# Altium schematic symbol library jlcpcb_2025_04_inductors_extended_0805.schlib: 882 symbols (part 2 of 5) (continued)
## GBL201209P-2R2K
designator L?  Inductance: 2.2uH
Inductor, 2.2uH, ±10%, 650mΩ, 30mA, SMD 0805; Manufacturer: Gotrend Tech; Manufacturer Part Number: GBL201209P-2R2K; Package Size: 0805; JLCPCB Basic Part: No; JLCPCB Part Number: C226155; Supplier 1: LCSC; Category: Inductors; Supplier Part Number 1: C226155; Tolerance: ±10%; Rated Current: 30mA; DC Resistance: 650mΩ; RoHS: Yes; ComponentLink1Description: Datasheet; ComponentLink1URL: https://wmsc.lcsc.com/wmsc/upload/file/pdf/v2/lcsc/1809211933_Gotrend-Tech-GBL201209P-2R2K_C226155.pdf; ComponentLink2Description: JLCPCB Part URL; ComponentLink2URL: https://jlcpcb.com/partdetail/C226155; ComponentLink3Description: LCSC Part URL; ComponentLink3URL: https://lcsc.com/product-detail/Inductors-SMD_Gotrend-Tech-Gotrend-Tech-GBL201209P-2R2K_C226155.html
footprint IND-0805 (0805 (2012M) Inductor)
pins: 1, 2

## GGW0805UCR68KGT
designator L?  Inductance: 680nH
Inductor, 680nH, ±10%, 2.1Ω, 190mA, SMD 0805; Manufacturer: GOOGLL(Zhaoqing Guoju Elec); Manufacturer Part Number: GGW0805UCR68KGT; Self-Resonant Frequency: 300MHz; Q Factor: 23@50MHz; Package Size: 0805; JLCPCB Basic Part: No; JLCPCB Part Number: C343182; Supplier 1: LCSC; Category: Inductors; Supplier Part Number 1: C343182; Tolerance: ±10%; Rated Current: 190mA; DC Resistance: 2.1Ω; RoHS: Yes; ComponentLink1Description: Datasheet; ComponentLink1URL: https://datasheet.lcsc.com/lcsc/1912111437_GOOGLL-Zhaoqing-Guoju-Elec-GGW0805UCR68KGT_C343182.pdf; ComponentLink2Description: JLCPCB Part URL; ComponentLink2URL: https://jlcpcb.com/partdetail/C343182; ComponentLink3Description: LCSC Part URL; ComponentLink3URL: https://lcsc.com/product-detail/Inductors-SMD_GOOGLLZhaoqing-Guoju-Elec-GOOGLLZhaoqing-Guoju-Elec-GGW0805UCR68KGT_C343182.html
footprint IND-0805 (0805 (2012M) Inductor)
pins: 1, 2

## HBLS2012-1N0S
designator L?  Inductance: 1nH
Inductor, 1nH, 0.1Ω, 600mA, SMD 0805; Manufacturer: HYHONGYEX; Manufacturer Part Number: HBLS2012-1N0S; Self-Resonant Frequency: 3GHz; Q Factor: 10@100MHz; Package Size: 0805; JLCPCB Basic Part: No; JLCPCB Part Number: C964052; Supplier 1: LCSC; Category: Inductors; Supplier Part Number 1: C964052; Rated Current: 600mA; DC Resistance: 0.1Ω; RoHS: Yes; ComponentLink1Description: Datasheet; ComponentLink1URL: https://wmsc.lcsc.com/wmsc/upload/file/pdf/v2/lcsc/2012171939_HYHONGYEX-HBLS2012-1N0S_C964052.pdf; ComponentLink2Description: JLCPCB Part URL; ComponentLink2URL: https://jlcpcb.com/partdetail/C964052; ComponentLink3Description: LCSC Part URL; ComponentLink3URL: https://lcsc.com/product-detail/Inductors-SMD_HYHONGYEX-HYHONGYEX-HBLS2012-1N0S_C964052.html
footprint IND-0805 (0805 (2012M) Inductor)
pins: 1, 2

## HBLS2012-1N5S
designator L?  Inductance: 1.5nH
Inductor, 1.5nH, 0.1Ω, 600mA, SMD 0805; Manufacturer: HYHONGYEX; Manufacturer Part Number: HBLS2012-1N5S; Self-Resonant Frequency: 3GHz; Q Factor: 10@100MHz; Package Size: 0805; JLCPCB Basic Part: No; JLCPCB Part Number: C964053; Supplier 1: LCSC; Category: Inductors; Supplier Part Number 1: C964053; Rated Current: 600mA; DC Resistance: 0.1Ω; RoHS: Yes; ComponentLink1Description: Datasheet; ComponentLink1URL: https://wmsc.lcsc.com/wmsc/upload/file/pdf/v2/lcsc/2012171939_HYHONGYEX-HBLS2012-1N5S_C964053.pdf; ComponentLink2Description: JLCPCB Part URL; ComponentLink2URL: https://jlcpcb.com/partdetail/C964053; ComponentLink3Description: LCSC Part URL; ComponentLink3URL: https://lcsc.com/product-detail/Inductors-SMD_HYHONGYEX-HYHONGYEX-HBLS2012-1N5S_C964053.html
footprint IND-0805 (0805 (2012M) Inductor)
pins: 1, 2

## HBLS2012-2N2S
designator L?  Inductance: 2.2nH
Inductor, 2.2nH, 0.1Ω, 600mA, SMD 0805; Manufacturer: HYHONGYEX; Manufacturer Part Number: HBLS2012-2N2S; Self-Resonant Frequency: 3GHz; Q Factor: 10@100MHz; Package Size: 0805; JLCPCB Basic Part: No; JLCPCB Part Number: C964055; Supplier 1: LCSC; Category: Inductors; Supplier Part Number 1: C964055; Rated Current: 600mA; DC Resistance: 0.1Ω; RoHS: Yes; ComponentLink1Description: Datasheet; ComponentLink1URL: https://wmsc.lcsc.com/wmsc/upload/file/pdf/v2/lcsc/2012171939_HYHONGYEX-HBLS2012-2N2S_C964055.pdf; ComponentLink2Description: JLCPCB Part URL; ComponentLink2URL: https://jlcpcb.com/partdetail/C964055; ComponentLink3Description: LCSC Part URL; ComponentLink3URL: https://lcsc.com/product-detail/Inductors-SMD_HYHONGYEX-HYHONGYEX-HBLS2012-2N2S_C964055.html
footprint IND-0805 (0805 (2012M) Inductor)
pins: 1, 2

## HBLS2012-3N9S
designator L?  Inductance: 3.9nH
Inductor, 3.9nH, 0.15Ω, 600mA, SMD 0805; Manufacturer: HYHONGYEX; Manufacturer Part Number: HBLS2012-3N9S; Self-Resonant Frequency: 3GHz; Q Factor: 10@100MHz; Package Size: 0805; JLCPCB Basic Part: No; JLCPCB Part Number: C964058; Supplier 1: LCSC; Category: Inductors; Supplier Part Number 1: C964058; Rated Current: 600mA; DC Resistance: 0.15Ω; RoHS: Yes; ComponentLink1Description: Datasheet; ComponentLink1URL: https://wmsc.lcsc.com/wmsc/upload/file/pdf/v2/lcsc/2012171939_HYHONGYEX-HBLS2012-3N9S_C964058.pdf; ComponentLink2Description: JLCPCB Part URL; ComponentLink2URL: https://jlcpcb.com/partdetail/C964058; ComponentLink3Description: LCSC Part URL; ComponentLink3URL: https://lcsc.com/product-detail/Inductors-SMD_HYHONGYEX-HYHONGYEX-HBLS2012-3N9S_C964058.html
footprint IND-0805 (0805 (2012M) Inductor)
pins: 1, 2

## HBLS2012-4N7S
designator L?  Inductance: 4.7nH
Inductor, 4.7nH, 0.2Ω, 400mA, SMD 0805; Manufacturer: HYHONGYEX; Manufacturer Part Number: HBLS2012-4N7S; Self-Resonant Frequency: 3GHz; Q Factor: 10@100MHz; Package Size: 0805; JLCPCB Basic Part: No; JLCPCB Part Number: C964059; Supplier 1: LCSC; Category: Inductors; Supplier Part Number 1: C964059; Rated Current: 400mA; DC Resistance: 0.2Ω; RoHS: Yes; ComponentLink1Description: Datasheet; ComponentLink1URL: https://wmsc.lcsc.com/wmsc/upload/file/pdf/v2/lcsc/2012171940_HYHONGYEX-HBLS2012-4N7S_C964059.pdf; ComponentLink2Description: JLCPCB Part URL; ComponentLink2URL: https://jlcpcb.com/partdetail/C964059; ComponentLink3Description: LCSC Part URL; ComponentLink3URL: https://lcsc.com/product-detail/Inductors-SMD_HYHONGYEX-HYHONGYEX-HBLS2012-4N7S_C964059.html
footprint IND-0805 (0805 (2012M) Inductor)
pins: 1, 2

## HBLS2012-10NJ
designator L?  Inductance: 10nH
Inductor, 10nH, ±5%, 0.3Ω, 300mA, SMD 0805; Manufacturer: HYHONGYEX; Manufacturer Part Number: HBLS2012-10NJ; Self-Resonant Frequency: 2.5GHz; Q Factor: 10@100MHz; Package Size: 0805; JLCPCB Basic Part: No; JLCPCB Part Number: C964063; Supplier 1: LCSC; Category: Inductors; Supplier Part Number 1: C964063; Tolerance: ±5%; Rated Current: 300mA; DC Resistance: 0.3Ω; RoHS: Yes; ComponentLink1Description: Datasheet; ComponentLink1URL: https://wmsc.lcsc.com/wmsc/upload/file/pdf/v2/lcsc/2012171940_HYHONGYEX-HBLS2012-10NJ_C964063.pdf; ComponentLink2Description: JLCPCB Part URL; ComponentLink2URL: https://jlcpcb.com/partdetail/C964063; ComponentLink3Description: LCSC Part URL; ComponentLink3URL: https://lcsc.com/product-detail/Inductors-SMD_HYHONGYEX-HYHONGYEX-HBLS2012-10NJ_C964063.html
footprint IND-0805 (0805 (2012M) Inductor)
pins: 1, 2

## HBLS2012-12NJ
designator L?  Inductance: 12nH
Inductor, 12nH, ±5%, 0.3Ω, 300mA, SMD 0805; Manufacturer: HYHONGYEX; Manufacturer Part Number: HBLS2012-12NJ; Self-Resonant Frequency: 2.45GHz; Q Factor: 10@100MHz; Package Size: 0805; JLCPCB Basic Part: No; JLCPCB Part Number: C964064; Supplier 1: LCSC; Category: Inductors; Supplier Part Number 1: C964064; Tolerance: ±5%; Rated Current: 300mA; DC Resistance: 0.3Ω; RoHS: Yes; ComponentLink1Description: Datasheet; ComponentLink1URL: https://wmsc.lcsc.com/wmsc/upload/file/pdf/v2/lcsc/2012171940_HYHONGYEX-HBLS2012-12NJ_C964064.pdf; ComponentLink2Description: JLCPCB Part URL; ComponentLink2URL: https://jlcpcb.com/partdetail/C964064; ComponentLink3Description: LCSC Part URL; ComponentLink3URL: https://lcsc.com/product-detail/Inductors-SMD_HYHONGYEX-HYHONGYEX-HBLS2012-12NJ_C964064.html
footprint IND-0805 (0805 (2012M) Inductor)
pins: 1, 2

## HBLS2012-15NJ
designator L?  Inductance: 15nH
Inductor, 15nH, ±5%, 0.4Ω, 300mA, SMD 0805; Manufacturer: HYHONGYEX; Manufacturer Part Number: HBLS2012-15NJ; Self-Resonant Frequency: 2GHz; Q Factor: 10@100MHz; Package Size: 0805; JLCPCB Basic Part: No; JLCPCB Part Number: C964065; Supplier 1: LCSC; Category: Inductors; Supplier Part Number 1: C964065; Tolerance: ±5%; Rated Current: 300mA; DC Resistance: 0.4Ω; RoHS: Yes; ComponentLink1Description: Datasheet; ComponentLink1URL: https://wmsc.lcsc.com/wmsc/upload/file/pdf/v2/lcsc/2012171940_HYHONGYEX-HBLS2012-15NJ_C964065.pdf; ComponentLink2Description: JLCPCB Part URL; ComponentLink2URL: https://jlcpcb.com/partdetail/C964065; ComponentLink3Description: LCSC Part URL; ComponentLink3URL: https://lcsc.com/product-detail/Inductors-SMD_HYHONGYEX-HYHONGYEX-HBLS2012-15NJ_C964065.html
footprint IND-0805 (0805 (2012M) Inductor)
pins: 1, 2

## HBLS2012-18NJ
designator L?  Inductance: 18nH
Inductor, 18nH, ±5%, 0.45Ω, 300mA, SMD 0805; Manufacturer: HYHONGYEX; Manufacturer Part Number: HBLS2012-18NJ; Self-Resonant Frequency: 1.75GHz; Q Factor: 10@100MHz; Package Size: 0805; JLCPCB Basic Part: No; JLCPCB Part Number: C964066; Supplier 1: LCSC; Category: Inductors; Supplier Part Number 1: C964066; Tolerance: ±5%; Rated Current: 300mA; DC Resistance: 0.45Ω; RoHS: Yes; ComponentLink1Description: Datasheet; ComponentLink1URL: https://wmsc.lcsc.com/wmsc/upload/file/pdf/v2/lcsc/2012171940_HYHONGYEX-HBLS2012-18NJ_C964066.pdf; ComponentLink2Description: JLCPCB Part URL; ComponentLink2URL: https://jlcpcb.com/partdetail/C964066; ComponentLink3Description: LCSC Part URL; ComponentLink3URL: https://lcsc.com/product-detail/Inductors-SMD_HYHONGYEX-HYHONGYEX-HBLS2012-18NJ_C964066.html
footprint IND-0805 (0805 (2012M) Inductor)
pins: 1, 2

## HBLS2012-22NJ
designator L?  Inductance: 22nH
Inductor, 22nH, ±5%, 0.5Ω, 300mA, SMD 0805; Manufacturer: HYHONGYEX; Manufacturer Part Number: HBLS2012-22NJ; Self-Resonant Frequency: 1.7GHz; Q Factor: 10@100MHz; Package Size: 0805; JLCPCB Basic Part: No; JLCPCB Part Number: C964067; Supplier 1: LCSC; Category: Inductors; Supplier Part Number 1: C964067; Tolerance: ±5%; Rated Current: 300mA; DC Resistance: 0.5Ω; RoHS: Yes; ComponentLink1Description: Datasheet; ComponentLink1URL: https://wmsc.lcsc.com/wmsc/upload/file/pdf/v2/lcsc/2201131330_HYHONGYEX-HBLS2012-22NJ_C964067.pdf; ComponentLink2Description: JLCPCB Part URL; ComponentLink2URL: https://jlcpcb.com/partdetail/C964067; ComponentLink3Description: LCSC Part URL; ComponentLink3URL: https://lcsc.com/product-detail/Inductors-SMD_HYHONGYEX-HYHONGYEX-HBLS2012-22NJ_C964067.html
footprint IND-0805 (0805 (2012M) Inductor)
pins: 1, 2

## HBLS2012-27NJ
designator L?  Inductance: 27nH
Inductor, 27nH, ±5%, 0.55Ω, 300mA, SMD 0805; Manufacturer: HYHONGYEX; Manufacturer Part Number: HBLS2012-27NJ; Self-Resonant Frequency: 1.55GHz; Q Factor: 10@100MHz; Package Size: 0805; JLCPCB Basic Part: No; JLCPCB Part Number: C964068; Supplier 1: LCSC; Category: Inductors; Supplier Part Number 1: C964068; Tolerance: ±5%; Rated Current: 300mA; DC Resistance: 0.55Ω; RoHS: Yes; ComponentLink1Description: Datasheet; ComponentLink1URL: https://wmsc.lcsc.com/wmsc/upload/file/pdf/v2/lcsc/2012171940_HYHONGYEX-HBLS2012-27NJ_C964068.pdf; ComponentLink2Description: JLCPCB Part URL; ComponentLink2URL: https://jlcpcb.com/partdetail/C964068; ComponentLink3Description: LCSC Part URL; ComponentLink3URL: https://lcsc.com/product-detail/Inductors-SMD_HYHONGYEX-HYHONGYEX-HBLS2012-27NJ_C964068.html
footprint IND-0805 (0805 (2012M) Inductor)
pins: 1, 2

## HBLS2012-33NJ
designator L?  Inductance: 33nH
Inductor, 33nH, ±5%, 0.6Ω, 300mA, SMD 0805; Manufacturer: HYHONGYEX; Manufacturer Part Number: HBLS2012-33NJ; Self-Resonant Frequency: 1.35GHz; Q Factor: 10@100MHz; Package Size: 0805; JLCPCB Basic Part: No; JLCPCB Part Number: C964069; Supplier 1: LCSC; Category: Inductors; Supplier Part Number 1: C964069; Tolerance: ±5%; Rated Current: 300mA; DC Resistance: 0.6Ω; RoHS: Yes; ComponentLink1Description: Datasheet; ComponentLink1URL: https://wmsc.lcsc.com/wmsc/upload/file/pdf/v2/lcsc/2012171940_HYHONGYEX-HBLS2012-33NJ_C964069.pdf; ComponentLink2Description: JLCPCB Part URL; ComponentLink2URL: https://jlcpcb.com/partdetail/C964069; ComponentLink3Description: LCSC Part URL; ComponentLink3URL: https://lcsc.com/product-detail/Inductors-SMD_HYHONGYEX-HYHONGYEX-HBLS2012-33NJ_C964069.html
footprint IND-0805 (0805 (2012M) Inductor)
pins: 1, 2

## HBLS2012-39NJ
designator L?  Inductance: 39nH
Inductor, 39nH, ±5%, 0.65Ω, 300mA, SMD 0805; Manufacturer: HYHONGYEX; Manufacturer Part Number: HBLS2012-39NJ; Self-Resonant Frequency: 1.3GHz; Q Factor: 13@100MHz; Package Size: 0805; JLCPCB Basic Part: No; JLCPCB Part Number: C964070; Supplier 1: LCSC; Category: Inductors; Supplier Part Number 1: C964070; Tolerance: ±5%; Rated Current: 300mA; DC Resistance: 0.65Ω; RoHS: Yes; ComponentLink1Description: Datasheet; ComponentLink1URL: https://wmsc.lcsc.com/wmsc/upload/file/pdf/v2/lcsc/2012171940_HYHONGYEX-HBLS2012-39NJ_C964070.pdf; ComponentLink2Description: JLCPCB Part URL; ComponentLink2URL: https://jlcpcb.com/partdetail/C964070; ComponentLink3Description: LCSC Part URL; ComponentLink3URL: https://lcsc.com/product-detail/Inductors-SMD_HYHONGYEX-HYHONGYEX-HBLS2012-39NJ_C964070.html
footprint IND-0805 (0805 (2012M) Inductor)
pins: 1, 2

## HBLS2012-47NJ
designator L?  Inductance: 47nH
Inductor, 47nH, ±5%, 0.7Ω, 300mA, SMD 0805; Manufacturer: HYHONGYEX; Manufacturer Part Number: HBLS2012-47NJ; Self-Resonant Frequency: 1.2GHz; Q Factor: 15@100MHz; Package Size: 0805; JLCPCB Basic Part: No; JLCPCB Part Number: C964071; Supplier 1: LCSC; Category: Inductors; Supplier Part Number 1: C964071; Tolerance: ±5%; Rated Current: 300mA; DC Resistance: 0.7Ω; RoHS: Yes; ComponentLink1Description: Datasheet; ComponentLink1URL: https://wmsc.lcsc.com/wmsc/upload/file/pdf/v2/lcsc/2012171940_HYHONGYEX-HBLS2012-47NJ_C964071.pdf; ComponentLink2Description: JLCPCB Part URL; ComponentLink2URL: https://jlcpcb.com/partdetail/C964071; ComponentLink3Description: LCSC Part URL; ComponentLink3URL: https://lcsc.com/product-detail/Inductors-SMD_HYHONGYEX-HYHONGYEX-HBLS2012-47NJ_C964071.html
footprint IND-0805 (0805 (2012M) Inductor)
pins: 1, 2

## HBLS2012-56NJ
designator L?  Inductance: 56nH
Inductor, 56nH, ±5%, 0.75Ω, 300mA, SMD 0805; Manufacturer: HYHONGYEX; Manufacturer Part Number: HBLS2012-56NJ; Self-Resonant Frequency: 1.15GHz; Q Factor: 15@100MHz; Package Size: 0805; JLCPCB Basic Part: No; JLCPCB Part Number: C964072; Supplier 1: LCSC; Category: Inductors; Supplier Part Number 1: C964072; Tolerance: ±5%; Rated Current: 300mA; DC Resistance: 0.75Ω; RoHS: Yes; ComponentLink1Description: Datasheet; ComponentLink1URL: https://wmsc.lcsc.com/wmsc/upload/file/pdf/v2/lcsc/2012171940_HYHONGYEX-HBLS2012-56NJ_C964072.pdf; ComponentLink2Description: JLCPCB Part URL; ComponentLink2URL: https://jlcpcb.com/partdetail/C964072; ComponentLink3Description: LCSC Part URL; ComponentLink3URL: https://lcsc.com/product-detail/Inductors-SMD_HYHONGYEX-HYHONGYEX-HBLS2012-56NJ_C964072.html
footprint IND-0805 (0805 (2012M) Inductor)
pins: 1, 2

## HBLS2012-68NJ
designator L?  Inductance: 68nH
Inductor, 68nH, ±5%, 0.8Ω, 300mA, SMD 0805; Manufacturer: HYHONGYEX; Manufacturer Part Number: HBLS2012-68NJ; Self-Resonant Frequency: 1GHz; Q Factor: 15@100MHz; Package Size: 0805; JLCPCB Basic Part: No; JLCPCB Part Number: C964073; Supplier 1: LCSC; Category: Inductors; Supplier Part Number 1: C964073; Tolerance: ±5%; Rated Current: 300mA; DC Resistance: 0.8Ω; RoHS: Yes; ComponentLink1Description: Datasheet; ComponentLink1URL: https://wmsc.lcsc.com/wmsc/upload/file/pdf/v2/lcsc/2012171940_HYHONGYEX-HBLS2012-68NJ_C964073.pdf; ComponentLink2Description: JLCPCB Part URL; ComponentLink2URL: https://jlcpcb.com/partdetail/C964073; ComponentLink3Description: LCSC Part URL; ComponentLink3URL: https://lcsc.com/product-detail/Inductors-SMD_HYHONGYEX-HYHONGYEX-HBLS2012-68NJ_C964073.html
footprint IND-0805 (0805 (2012M) Inductor)
pins: 1, 2

## HBLS2012-82NJ
designator L?  Inductance: 82nH
Inductor, 82nH, ±5%, 0.9Ω, 300mA, SMD 0805; Manufacturer: HYHONGYEX; Manufacturer Part Number: HBLS2012-82NJ; Self-Resonant Frequency: 850MHz; Q Factor: 15@100MHz; Package Size: 0805; JLCPCB Basic Part: No; JLCPCB Part Number: C964074; Supplier 1: LCSC; Category: Inductors; Supplier Part Number 1: C964074; Tolerance: ±5%; Rated Current: 300mA; DC Resistance: 0.9Ω; RoHS: Yes; ComponentLink1Description: Datasheet; ComponentLink1URL: https://wmsc.lcsc.com/wmsc/upload/file/pdf/v2/lcsc/2012171940_HYHONGYEX-HBLS2012-82NJ_C964074.pdf; ComponentLink2Description: JLCPCB Part URL; ComponentLink2URL: https://jlcpcb.com/partdetail/C964074; ComponentLink3Description: LCSC Part URL; ComponentLink3URL: https://lcsc.com/product-detail/Inductors-SMD_HYHONGYEX-HYHONGYEX-HBLS2012-82NJ_C964074.html
footprint IND-0805 (0805 (2012M) Inductor)
pins: 1, 2

## HBLS2012-R10J
designator L?  Inductance: 100nH
Inductor, 100nH, ±5%, 1Ω, 300mA, SMD 0805; Manufacturer: HYHONGYEX; Manufacturer Part Number: HBLS2012-R10J; Self-Resonant Frequency: 600MHz; Q Factor: 15@100MHz; Package Size: 0805; JLCPCB Basic Part: No; JLCPCB Part Number: C964075; Supplier 1: LCSC; Category: Inductors; Supplier Part Number 1: C964075; Tolerance: ±5%; Rated Current: 300mA; DC Resistance: 1Ω; RoHS: Yes; ComponentLink1Description: Datasheet; ComponentLink1URL: https://wmsc.lcsc.com/wmsc/upload/file/pdf/v2/lcsc/2012171940_HYHONGYEX-HBLS2012-R10J_C964075.pdf; ComponentLink2Description: JLCPCB Part URL; ComponentLink2URL: https://jlcpcb.com/partdetail/C964075; ComponentLink3Description: LCSC Part URL; ComponentLink3URL: https://lcsc.com/product-detail/Inductors-SMD_HYHONGYEX-HYHONGYEX-HBLS2012-R10J_C964075.html
footprint IND-0805 (0805 (2012M) Inductor)
pins: 1, 2

## HBLS2012-R15J
designator L?  Inductance: 150nH
Inductor, 150nH, ±5%, 1.5Ω, 300mA, SMD 0805; Manufacturer: HYHONGYEX; Manufacturer Part Number: HBLS2012-R15J; Self-Resonant Frequency: 500MHz; Q Factor: 15@50MHz; Package Size: 0805; JLCPCB Basic Part: No; JLCPCB Part Number: C964077; Supplier 1: LCSC; Category: Inductors; Supplier Part Number 1: C964077; Tolerance: ±5%; Rated Current: 300mA; DC Resistance: 1.5Ω; RoHS: Yes; ComponentLink1Description: Datasheet; ComponentLink1URL: https://wmsc.lcsc.com/wmsc/upload/file/pdf/v2/lcsc/2012171941_HYHONGYEX-HBLS2012-R15J_C964077.pdf; ComponentLink2Description: JLCPCB Part URL; ComponentLink2URL: https://jlcpcb.com/partdetail/C964077; ComponentLink3Description: LCSC Part URL; ComponentLink3URL: https://lcsc.com/product-detail/Inductors-SMD_HYHONGYEX-HYHONGYEX-HBLS2012-R15J_C964077.html
footprint IND-0805 (0805 (2012M) Inductor)
pins: 1, 2

## HBLS2012-R18J
designator L?  Inductance: 180nH
Inductor, 180nH, ±5%, 1.8Ω, 300mA, SMD 0805; Manufacturer: HYHONGYEX; Manufacturer Part Number: HBLS2012-R18J; Package Size: 0805; JLCPCB Basic Part: No; JLCPCB Part Number: C964078; Supplier 1: LCSC; Category: Inductors; Supplier Part Number 1: C964078; Tolerance: ±5%; Rated Current: 300mA; DC Resistance: 1.8Ω; RoHS: Yes; ComponentLink1Description: Datasheet; ComponentLink1URL: https://wmsc.lcsc.com/wmsc/upload/file/pdf/v2/lcsc/2012171941_HYHONGYEX-HBLS2012-R18J_C964078.pdf; ComponentLink2Description: JLCPCB Part URL; ComponentLink2URL: https://jlcpcb.com/partdetail/C964078; ComponentLink3Description: LCSC Part URL; ComponentLink3URL: https://lcsc.com/product-detail/Inductors-SMD_HYHONGYEX-HYHONGYEX-HBLS2012-R18J_C964078.html
footprint IND-0805 (0805 (2012M) Inductor)
pins: 1, 2

## HBLS2012-R33J
designator L?  Inductance: 330nH
Inductor, 330nH, ±5%, 3Ω, 200mA, SMD 0805; Manufacturer: HYHONGYEX; Manufacturer Part Number: HBLS2012-R33J; Package Size: 0805; JLCPCB Basic Part: No; JLCPCB Part Number: C964081; Supplier 1: LCSC; Category: Inductors; Supplier Part Number 1: C964081; Tolerance: ±5%; Rated Current: 200mA; DC Resistance: 3Ω; RoHS: Yes; ComponentLink1Description: Datasheet; ComponentLink1URL: https://wmsc.lcsc.com/wmsc/upload/file/pdf/v2/lcsc/2012171941_HYHONGYEX-HBLS2012-R33J_C964081.pdf; ComponentLink2Description: JLCPCB Part URL; ComponentLink2URL: https://jlcpcb.com/partdetail/C964081; ComponentLink3Description: LCSC Part URL; ComponentLink3URL: https://lcsc.com/product-detail/Inductors-SMD_HYHONGYEX-HYHONGYEX-HBLS2012-R33J_C964081.html
footprint IND-0805 (0805 (2012M) Inductor)
pins: 1, 2

## HBLS2012-R47J
designator L?  Inductance: 470nH
Inductor, 470nH, ±5%, SMD 0805; Manufacturer: HYHONGYEX; Manufacturer Part Number: HBLS2012-R47J; Package Size: 0805; JLCPCB Basic Part: No; JLCPCB Part Number: C964083; Supplier 1: LCSC; Category: Inductors; Supplier Part Number 1: C964083; Tolerance: ±5%; RoHS: Yes; ComponentLink1Description: Datasheet; ComponentLink1URL: https://wmsc.lcsc.com/wmsc/upload/file/pdf/v2/lcsc/2012171941_HYHONGYEX-HBLS2012-R47J_C964083.pdf; ComponentLink2Description: JLCPCB Part URL; ComponentLink2URL: https://jlcpcb.com/partdetail/C964083; ComponentLink3Description: LCSC Part URL; ComponentLink3URL: https://lcsc.com/product-detail/Inductors-SMD_HYHONGYEX-HYHONGYEX-HBLS2012-R47J_C964083.html
footprint IND-0805 (0805 (2012M) Inductor)
pins: 1, 2

## HEI201610B-R10N-Q8DH
designator L?  Inductance: 100nH
Inductor, 100nH, SMD 0805; Manufacturer: Chilisin Elec; Manufacturer Part Number: HEI201610B-R10N-Q8DH; Package Size: 0805; JLCPCB Basic Part: No; JLCPCB Part Number: C2991861; Supplier 1: LCSC; Category: Inductors; Supplier Part Number 1: C2991861; RoHS: Yes; ComponentLink1Description: Datasheet; ComponentLink2Description: JLCPCB Part URL; ComponentLink2URL: https://jlcpcb.com/partdetail/C2991861; ComponentLink3Description: LCSC Part URL; ComponentLink3URL: https://lcsc.com/product-detail/Inductors-SMD_Chilisin-Elec-Chilisin-Elec-HEI201610B-R10N-Q8DH_C2991861.html
footprint IND-0805 (0805 (2012M) Inductor)
pins: 1, 2

## HK2125R39J-T
designator L?  Inductance: 390nH
Inductor, 390nH, ±5%, 850mΩ, 300mA, SMD 0805; Manufacturer: Taiyo Yuden; Manufacturer Part Number: HK2125R39J-T; Self-Resonant Frequency: 250MHz; Q Factor: 10@50MHz; Package Size: 0805; JLCPCB Basic Part: No; JLCPCB Part Number: C524975; Supplier 1: LCSC; Category: Inductors; Supplier Part Number 1: C524975; Tolerance: ±5%; Rated Current: 300mA; DC Resistance: 850mΩ; RoHS: Yes; ComponentLink1Description: Datasheet; ComponentLink1URL: https://wmsc.lcsc.com/wmsc/upload/file/pdf/v2/lcsc/2008261839_Taiyo-Yuden-HK2125R39J-T_C524975.pdf; ComponentLink2Description: JLCPCB Part URL; ComponentLink2URL: https://jlcpcb.com/partdetail/C524975; ComponentLink3Description: LCSC Part URL; ComponentLink3URL: https://lcsc.com/product-detail/Inductors-SMD_Taiyo-Yuden-Taiyo-Yuden-HK2125R39J-T_C524975.html
footprint IND-0805 (0805 (2012M) Inductor)
pins: 1, 2

## HSC0805-1R0J-T
designator L?  Inductance: 1uH
Inductor, 1uH, ±5%, 2.45Ω, 180mA, SMD 0805; Manufacturer: EMTEK; Manufacturer Part Number: HSC0805-1R0J-T; Self-Resonant Frequency: 200MHz; Q Factor: 22@50MHz; Package Size: 0805; JLCPCB Basic Part: No; JLCPCB Part Number: C251848; Supplier 1: LCSC; Category: Inductors; Supplier Part Number 1: C251848; Tolerance: ±5%; Rated Current: 180mA; DC Resistance: 2.45Ω; RoHS: Yes; ComponentLink1Description: Datasheet; ComponentLink1URL: https://wmsc.lcsc.com/wmsc/upload/file/pdf/v2/lcsc/2304140030_EMTEK-HSC0805-1R0J-T_C251848.pdf; ComponentLink2Description: JLCPCB Part URL; ComponentLink2URL: https://jlcpcb.com/partdetail/C251848; ComponentLink3Description: LCSC Part URL; ComponentLink3URL: https://lcsc.com/product-detail/Inductors-SMD_EMTEK-EMTEK-HSC0805-1R0J-T_C251848.html
footprint IND-0805 (0805 (2012M) Inductor)
pins: 1, 2

## HSC0805-1R2J-T
designator L?  Inductance: 1.2uH
Inductor, 1.2uH, ±5%, 2.45Ω, 170mA, SMD 0805; Manufacturer: EMTEK; Manufacturer Part Number: HSC0805-1R2J-T; Self-Resonant Frequency: 160MHz; Q Factor: 16@7.9MHz; Package Size: 0805; JLCPCB Basic Part: No; JLCPCB Part Number: C251849; Supplier 1: LCSC; Category: Inductors; Supplier Part Number 1: C251849; Tolerance: ±5%; Rated Current: 170mA; DC Resistance: 2.45Ω; RoHS: Yes; ComponentLink1Description: Datasheet; ComponentLink1URL: https://wmsc.lcsc.com/wmsc/upload/file/pdf/v2/lcsc/2304140030_EMTEK-HSC0805-1R2J-T_C251849.pdf; ComponentLink2Description: JLCPCB Part URL; ComponentLink2URL: https://jlcpcb.com/partdetail/C251849; ComponentLink3Description: LCSC Part URL; ComponentLink3URL: https://lcsc.com/product-detail/Inductors-SMD_EMTEK-EMTEK-HSC0805-1R2J-T_C251849.html
footprint IND-0805 (0805 (2012M) Inductor)
pins: 1, 2

## HSC0805-1R5J-T
designator L?  Inductance: 1.5uH
Inductor, 1.5uH, ±5%, 2.5Ω, 170mA, SMD 0805; Manufacturer: EMTEK; Manufacturer Part Number: HSC0805-1R5J-T; Self-Resonant Frequency: 120MHz; Q Factor: 16@7.9MHz; Package Size: 0805; JLCPCB Basic Part: No; JLCPCB Part Number: C251850; Supplier 1: LCSC; Category: Inductors; Supplier Part Number 1: C251850; Tolerance: ±5%; Rated Current: 170mA; DC Resistance: 2.5Ω; RoHS: Yes; ComponentLink1Description: Datasheet; ComponentLink1URL: https://wmsc.lcsc.com/wmsc/upload/file/pdf/v2/lcsc/2304140030_EMTEK-HSC0805-1R5J-T_C251850.pdf; ComponentLink2Description: JLCPCB Part URL; ComponentLink2URL: https://jlcpcb.com/partdetail/C251850; ComponentLink3Description: LCSC Part URL; ComponentLink3URL: https://lcsc.com/product-detail/Inductors-SMD_EMTEK-EMTEK-HSC0805-1R5J-T_C251850.html
footprint IND-0805 (0805 (2012M) Inductor)
pins: 1, 2

## HSC0805-1R8J-T
designator L?  Inductance: 1.8uH
Inductor, 1.8uH, ±5%, 2.5Ω, 170mA, SMD 0805; Manufacturer: EMTEK; Manufacturer Part Number: HSC0805-1R8J-T; Self-Resonant Frequency: 80MHz; Q Factor: 16@7.9MHz; Package Size: 0805; JLCPCB Basic Part: No; JLCPCB Part Number: C251851; Supplier 1: LCSC; Category: Inductors; Supplier Part Number 1: C251851; Tolerance: ±5%; Rated Current: 170mA; DC Resistance: 2.5Ω; RoHS: Yes; ComponentLink1Description: Datasheet; ComponentLink1URL: https://wmsc.lcsc.com/wmsc/upload/file/pdf/v2/lcsc/2304140030_EMTEK-HSC0805-1R8J-T_C251851.pdf; ComponentLink2Description: JLCPCB Part URL; ComponentLink2URL: https://jlcpcb.com/partdetail/C251851; ComponentLink3Description: LCSC Part URL; ComponentLink3URL: https://lcsc.com/product-detail/Inductors-SMD_EMTEK-EMTEK-HSC0805-1R8J-T_C251851.html
footprint IND-0805 (0805 (2012M) Inductor)
pins: 1, 2

## HSC0805-2N2K-T
designator L?  Inductance: 2.2nH
Inductor, 2.2nH, ±10%, 800mA, SMD 0805; Manufacturer: EMTEK; Manufacturer Part Number: HSC0805-2N2K-T; Package Size: 0805; JLCPCB Basic Part: No; JLCPCB Part Number: C251816; Supplier 1: LCSC; Category: Inductors; Supplier Part Number 1: C251816; Tolerance: ±10%; Rated Current: 800mA; RoHS: Yes; ComponentLink1Description: Datasheet; ComponentLink1URL: https://wmsc.lcsc.com/wmsc/upload/file/pdf/v2/lcsc/2304140030_EMTEK-HSC0805-2N2K-T_C251816.pdf; ComponentLink2Description: JLCPCB Part URL; ComponentLink2URL: https://jlcpcb.com/partdetail/C251816; ComponentLink3Description: LCSC Part URL; ComponentLink3URL: https://lcsc.com/product-detail/Inductors-SMD_EMTEK-EMTEK-HSC0805-2N2K-T_C251816.html
footprint IND-0805 (0805 (2012M) Inductor)
pins: 1, 2

## HSC0805-2N8J-T
designator L?  Inductance: 2.8nH
Inductor, 2.8nH, ±5%, 60mΩ, 800mA, SMD 0805; Manufacturer: EMTEK; Manufacturer Part Number: HSC0805-2N8J-T; Self-Resonant Frequency: 7.9GHz; Q Factor: 55@1500MHz; Package Size: 0805; JLCPCB Basic Part: No; JLCPCB Part Number: C251857; Supplier 1: LCSC; Category: Inductors; Supplier Part Number 1: C251857; Tolerance: ±5%; Rated Current: 800mA; DC Resistance: 60mΩ; RoHS: Yes; ComponentLink1Description: Datasheet; ComponentLink1URL: https://wmsc.lcsc.com/wmsc/upload/file/pdf/v2/lcsc/2304140030_EMTEK-HSC0805-2N8J-T_C251857.pdf; ComponentLink2Description: JLCPCB Part URL; ComponentLink2URL: https://jlcpcb.com/partdetail/C251857; ComponentLink3Description: LCSC Part URL; ComponentLink3URL: https://lcsc.com/product-detail/Inductors-SMD_EMTEK-EMTEK-HSC0805-2N8J-T_C251857.html
footprint IND-0805 (0805 (2012M) Inductor)
pins: 1, 2

## HSC0805-2R2J-T
designator L?  Inductance: 2.2uH
Inductor, 2.2uH, ±5%, 2.7Ω, 160mA, SMD 0805; Manufacturer: EMTEK; Manufacturer Part Number: HSC0805-2R2J-T; Self-Resonant Frequency: 60MHz; Q Factor: 16@7.9MHz; Package Size: 0805; JLCPCB Basic Part: No; JLCPCB Part Number: C251852; Supplier 1: LCSC; Category: Inductors; Supplier Part Number 1: C251852; Tolerance: ±5%; Rated Current: 160mA; DC Resistance: 2.7Ω; RoHS: Yes; ComponentLink1Description: Datasheet; ComponentLink1URL: https://wmsc.lcsc.com/wmsc/upload/file/pdf/v2/lcsc/2304140030_EMTEK-HSC0805-2R2J-T_C251852.pdf; ComponentLink2Description: JLCPCB Part URL; ComponentLink2URL: https://jlcpcb.com/partdetail/C251852; ComponentLink3Description: LCSC Part URL; ComponentLink3URL: https://lcsc.com/product-detail/Inductors-SMD_EMTEK-EMTEK-HSC0805-2R2J-T_C251852.html
footprint IND-0805 (0805 (2012M) Inductor)
pins: 1, 2

## HSC0805-2R7J-T
designator L?  Inductance: 2.7uH
Inductor, 2.7uH, ±5%, 3.8Ω, 160mA, SMD 0805; Manufacturer: EMTEK; Manufacturer Part Number: HSC0805-2R7J-T; Self-Resonant Frequency: 50MHz; Q Factor: 16@7.9MHz; Package Size: 0805; JLCPCB Basic Part: No; JLCPCB Part Number: C251853; Supplier 1: LCSC; Category: Inductors; Supplier Part Number 1: C251853; Tolerance: ±5%; Rated Current: 160mA; DC Resistance: 3.8Ω; RoHS: Yes; ComponentLink1Description: Datasheet; ComponentLink1URL: https://wmsc.lcsc.com/wmsc/upload/file/pdf/v2/lcsc/2304140030_EMTEK-HSC0805-2R7J-T_C251853.pdf; ComponentLink2Description: JLCPCB Part URL; ComponentLink2URL: https://jlcpcb.com/partdetail/C251853; ComponentLink3Description: LCSC Part URL; ComponentLink3URL: https://lcsc.com/product-detail/Inductors-SMD_EMTEK-EMTEK-HSC0805-2R7J-T_C251853.html
footprint IND-0805 (0805 (2012M) Inductor)
pins: 1, 2

## HSC0805-3N3J-T
designator L?  Inductance: 3.3nH
Inductor, 3.3nH, ±5%, 120mΩ, 600mA, SMD 0805; Manufacturer: EMTEK; Manufacturer Part Number: HSC0805-3N3J-T; Self-Resonant Frequency: 7.9GHz; Q Factor: 45@1500MHz; Package Size: 0805; JLCPCB Basic Part: No; JLCPCB Part Number: C251817; Supplier 1: LCSC; Category: Inductors; Supplier Part Number 1: C251817; Tolerance: ±5%; Rated Current: 600mA; DC Resistance: 120mΩ; RoHS: Yes; ComponentLink1Description: Datasheet; ComponentLink1URL: https://wmsc.lcsc.com/wmsc/upload/file/pdf/v2/lcsc/2304140030_EMTEK-HSC0805-3N3J-T_C251817.pdf; ComponentLink2Description: JLCPCB Part URL; ComponentLink2URL: https://jlcpcb.com/partdetail/C251817; ComponentLink3Description: LCSC Part URL; ComponentLink3URL: https://lcsc.com/product-detail/Inductors-SMD_EMTEK-EMTEK-HSC0805-3N3J-T_C251817.html
footprint IND-0805 (0805 (2012M) Inductor)
pins: 1, 2

## HSC0805-4N1J-T
designator L?  Inductance: 4.1nH
Inductor, 4.1nH, ±5%, 600mA, SMD 0805; Manufacturer: EMTEK; Manufacturer Part Number: HSC0805-4N1J-T; Package Size: 0805; JLCPCB Basic Part: No; JLCPCB Part Number: C251855; Supplier 1: LCSC; Category: Inductors; Supplier Part Number 1: C251855; Tolerance: ±5%; Rated Current: 600mA; RoHS: Yes; ComponentLink1Description: Datasheet; ComponentLink1URL: https://wmsc.lcsc.com/wmsc/upload/file/pdf/v2/lcsc/2304140030_EMTEK-HSC0805-4N1J-T_C251855.pdf; ComponentLink2Description: JLCPCB Part URL; ComponentLink2URL: https://jlcpcb.com/partdetail/C251855; ComponentLink3Description: LCSC Part URL; ComponentLink3URL: https://lcsc.com/product-detail/Inductors-SMD_EMTEK-EMTEK-HSC0805-4N1J-T_C251855.html
footprint IND-0805 (0805 (2012M) Inductor)
pins: 1, 2

## HSC0805-5N1J-T
designator L?  Inductance: 5.1nH
Inductor, 5.1nH, ±5%, 60mΩ, 600mA, SMD 0805; Manufacturer: EMTEK; Manufacturer Part Number: HSC0805-5N1J-T; Self-Resonant Frequency: 5.8GHz; Q Factor: 60@1000MHz; Package Size: 0805; JLCPCB Basic Part: No; JLCPCB Part Number: C251858; Supplier 1: LCSC; Category: Inductors; Supplier Part Number 1: C251858; Tolerance: ±5%; Rated Current: 600mA; DC Resistance: 60mΩ; RoHS: Yes; ComponentLink1Description: Datasheet; ComponentLink1URL: https://wmsc.lcsc.com/wmsc/upload/file/pdf/v2/lcsc/2304140030_EMTEK-HSC0805-5N1J-T_C251858.pdf; ComponentLink2Description: JLCPCB Part URL; ComponentLink2URL: https://jlcpcb.com/partdetail/C251858; ComponentLink3Description: LCSC Part URL; ComponentLink3URL: https://lcsc.com/product-detail/Inductors-SMD_EMTEK-EMTEK-HSC0805-5N1J-T_C251858.html
footprint IND-0805 (0805 (2012M) Inductor)
pins: 1, 2

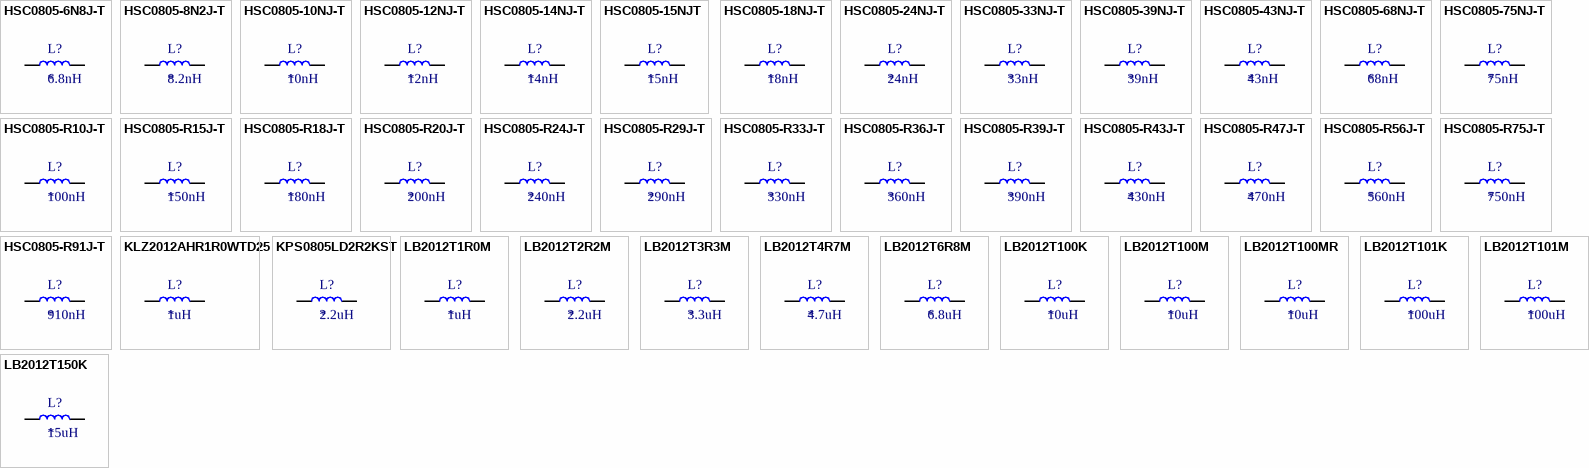
[diagram p9: symbols HSC0805-6N8J-T to LB2012T150K]

## HSC0805-6N8J-T
designator L?  Inductance: 6.8nH
Inductor, 6.8nH, ±5%, 110mΩ, 600mA, SMD 0805; Manufacturer: EMTEK; Manufacturer Part Number: HSC0805-6N8J-T; Self-Resonant Frequency: 5.5GHz; Q Factor: 50@1000MHz; Package Size: 0805; JLCPCB Basic Part: No; JLCPCB Part Number: C251818; Supplier 1: LCSC; Category: Inductors; Supplier Part Number 1: C251818; Tolerance: ±5%; Rated Current: 600mA; DC Resistance: 110mΩ; RoHS: Yes; ComponentLink1Description: Datasheet; ComponentLink1URL: https://wmsc.lcsc.com/wmsc/upload/file/pdf/v2/lcsc/2304140030_EMTEK-HSC0805-6N8J-T_C251818.pdf; ComponentLink2Description: JLCPCB Part URL; ComponentLink2URL: https://jlcpcb.com/partdetail/C251818; ComponentLink3Description: LCSC Part URL; ComponentLink3URL: https://lcsc.com/product-detail/Inductors-SMD_EMTEK-EMTEK-HSC0805-6N8J-T_C251818.html
footprint IND-0805 (0805 (2012M) Inductor)
pins: 1, 2

## HSC0805-8N2J-T
designator L?  Inductance: 8.2nH
Inductor, 8.2nH, ±5%, 160mΩ, 600mA, SMD 0805; Manufacturer: EMTEK; Manufacturer Part Number: HSC0805-8N2J-T; Self-Resonant Frequency: 4.7GHz; Q Factor: 50@1000MHz; Package Size: 0805; JLCPCB Basic Part: No; JLCPCB Part Number: C251819; Supplier 1: LCSC; Category: Inductors; Supplier Part Number 1: C251819; Tolerance: ±5%; Rated Current: 600mA; DC Resistance: 160mΩ; RoHS: Yes; ComponentLink1Description: Datasheet; ComponentLink1URL: https://wmsc.lcsc.com/wmsc/upload/file/pdf/v2/lcsc/2304140030_EMTEK-HSC0805-8N2J-T_C251819.pdf; ComponentLink2Description: JLCPCB Part URL; ComponentLink2URL: https://jlcpcb.com/partdetail/C251819; ComponentLink3Description: LCSC Part URL; ComponentLink3URL: https://lcsc.com/product-detail/Inductors-SMD_EMTEK-EMTEK-HSC0805-8N2J-T_C251819.html
footprint IND-0805 (0805 (2012M) Inductor)
pins: 1, 2

## HSC0805-10NJ-T
designator L?  Inductance: 10nH
Inductor, 10nH, ±5%, 100mΩ, 600mA, SMD 0805; Manufacturer: EMTEK; Manufacturer Part Number: HSC0805-10NJ-T; Self-Resonant Frequency: 4.2GHz; Q Factor: 60@500MHz; Package Size: 0805; JLCPCB Basic Part: No; JLCPCB Part Number: C251820; Supplier 1: LCSC; Category: Inductors; Supplier Part Number 1: C251820; Tolerance: ±5%; Rated Current: 600mA; DC Resistance: 100mΩ; RoHS: Yes; ComponentLink1Description: Datasheet; ComponentLink1URL: https://wmsc.lcsc.com/wmsc/upload/file/pdf/v2/lcsc/2304140030_EMTEK-HSC0805-10NJ-T_C251820.pdf; ComponentLink2Description: JLCPCB Part URL; ComponentLink2URL: https://jlcpcb.com/partdetail/C251820; ComponentLink3Description: LCSC Part URL; ComponentLink3URL: https://lcsc.com/product-detail/Inductors-SMD_EMTEK-EMTEK-HSC0805-10NJ-T_C251820.html
footprint IND-0805 (0805 (2012M) Inductor)
pins: 1, 2

## HSC0805-12NJ-T
designator L?  Inductance: 12nH
Inductor, 12nH, ±5%, 150mΩ, 600mA, SMD 0805; Manufacturer: EMTEK; Manufacturer Part Number: HSC0805-12NJ-T; Self-Resonant Frequency: 4GHz; Q Factor: 50@500MHz; Package Size: 0805; JLCPCB Basic Part: No; JLCPCB Part Number: C251821; Supplier 1: LCSC; Category: Inductors; Supplier Part Number 1: C251821; Tolerance: ±5%; Rated Current: 600mA; DC Resistance: 150mΩ; RoHS: Yes; ComponentLink1Description: Datasheet; ComponentLink1URL: https://wmsc.lcsc.com/wmsc/upload/file/pdf/v2/lcsc/2304140030_EMTEK-HSC0805-12NJ-T_C251821.pdf; ComponentLink2Description: JLCPCB Part URL; ComponentLink2URL: https://jlcpcb.com/partdetail/C251821; ComponentLink3Description: LCSC Part URL; ComponentLink3URL: https://lcsc.com/product-detail/Inductors-SMD_EMTEK-EMTEK-HSC0805-12NJ-T_C251821.html
footprint IND-0805 (0805 (2012M) Inductor)
pins: 1, 2

## HSC0805-14NJ-T
designator L?  Inductance: 14nH
Inductor, 14nH, ±5%, 600mA, SMD 0805; Manufacturer: EMTEK; Manufacturer Part Number: HSC0805-14NJ-T; Package Size: 0805; JLCPCB Basic Part: No; JLCPCB Part Number: C251854; Supplier 1: LCSC; Category: Inductors; Supplier Part Number 1: C251854; Tolerance: ±5%; Rated Current: 600mA; RoHS: Yes; ComponentLink1Description: Datasheet; ComponentLink1URL: https://wmsc.lcsc.com/wmsc/upload/file/pdf/v2/lcsc/2304140030_EMTEK-HSC0805-14NJ-T_C251854.pdf; ComponentLink2Description: JLCPCB Part URL; ComponentLink2URL: https://jlcpcb.com/partdetail/C251854; ComponentLink3Description: LCSC Part URL; ComponentLink3URL: https://lcsc.com/product-detail/Inductors-SMD_EMTEK-EMTEK-HSC0805-14NJ-T_C251854.html
footprint IND-0805 (0805 (2012M) Inductor)
pins: 1, 2

## HSC0805-15NJT
designator L?  Inductance: 15nH
Inductor, 15nH, ±5%, 170mΩ, 700mA, SMD 0805; Manufacturer: EMTEK; Manufacturer Part Number: HSC0805-15NJT; Self-Resonant Frequency: 3.4GHz; Q Factor: 50@500MHz; Package Size: 0805; JLCPCB Basic Part: No; JLCPCB Part Number: C251822; Supplier 1: LCSC; Category: Inductors; Supplier Part Number 1: C251822; Tolerance: ±5%; Rated Current: 700mA; DC Resistance: 170mΩ; RoHS: Yes; ComponentLink1Description: Datasheet; ComponentLink1URL: https://wmsc.lcsc.com/wmsc/upload/file/pdf/v2/lcsc/2304140030_EMTEK-HSC0805-15NJT_C251822.pdf; ComponentLink2Description: JLCPCB Part URL; ComponentLink2URL: https://jlcpcb.com/partdetail/C251822; ComponentLink3Description: LCSC Part URL; ComponentLink3URL: https://lcsc.com/product-detail/Inductors-SMD_EMTEK-EMTEK-HSC0805-15NJT_C251822.html
footprint IND-0805 (0805 (2012M) Inductor)
pins: 1, 2

## HSC0805-18NJ-T
designator L?  Inductance: 18nH
Inductor, 18nH, ±5%, 200mΩ, 600mA, SMD 0805; Manufacturer: EMTEK; Manufacturer Part Number: HSC0805-18NJ-T; Self-Resonant Frequency: 3.3GHz; Q Factor: 50@500MHz; Package Size: 0805; JLCPCB Basic Part: No; JLCPCB Part Number: C251823; Supplier 1: LCSC; Category: Inductors; Supplier Part Number 1: C251823; Tolerance: ±5%; Rated Current: 600mA; DC Resistance: 200mΩ; RoHS: Yes; ComponentLink1Description: Datasheet; ComponentLink1URL: https://wmsc.lcsc.com/wmsc/upload/file/pdf/v2/lcsc/2304140030_EMTEK-HSC0805-18NJ-T_C251823.pdf; ComponentLink2Description: JLCPCB Part URL; ComponentLink2URL: https://jlcpcb.com/partdetail/C251823; ComponentLink3Description: LCSC Part URL; ComponentLink3URL: https://lcsc.com/product-detail/Inductors-SMD_EMTEK-EMTEK-HSC0805-18NJ-T_C251823.html
footprint IND-0805 (0805 (2012M) Inductor)
pins: 1, 2

## HSC0805-24NJ-T
designator L?  Inductance: 24nH
Inductor, 24nH, ±5%, 220mΩ, 500mA, SMD 0805; Manufacturer: EMTEK; Manufacturer Part Number: HSC0805-24NJ-T; Self-Resonant Frequency: 2GHz; Q Factor: 50@500MHz; Package Size: 0805; JLCPCB Basic Part: No; JLCPCB Part Number: C251866; Supplier 1: LCSC; Category: Inductors; Supplier Part Number 1: C251866; Tolerance: ±5%; Rated Current: 500mA; DC Resistance: 220mΩ; RoHS: Yes; ComponentLink1Description: Datasheet; ComponentLink1URL: https://wmsc.lcsc.com/wmsc/upload/file/pdf/v2/lcsc/1809301232_EMTEK-HSC0805-24NJ-T_C251866.pdf; ComponentLink2Description: JLCPCB Part URL; ComponentLink2URL: https://jlcpcb.com/partdetail/C251866; ComponentLink3Description: LCSC Part URL; ComponentLink3URL: https://lcsc.com/product-detail/Inductors-SMD_EMTEK-EMTEK-HSC0805-24NJ-T_C251866.html
footprint IND-0805 (0805 (2012M) Inductor)
pins: 1, 2

## HSC0805-33NJ-T
designator L?  Inductance: 33nH
Inductor, 33nH, ±5%, 270mΩ, 500mA, SMD 0805; Manufacturer: EMTEK; Manufacturer Part Number: HSC0805-33NJ-T; Self-Resonant Frequency: 2.05GHz; Q Factor: 60@500MHz; Package Size: 0805; JLCPCB Basic Part: No; JLCPCB Part Number: C251826; Supplier 1: LCSC; Category: Inductors; Supplier Part Number 1: C251826; Tolerance: ±5%; Rated Current: 500mA; DC Resistance: 270mΩ; RoHS: Yes; ComponentLink1Description: Datasheet; ComponentLink1URL: https://wmsc.lcsc.com/wmsc/upload/file/pdf/v2/lcsc/2304140030_EMTEK-HSC0805-33NJ-T_C251826.pdf; ComponentLink2Description: JLCPCB Part URL; ComponentLink2URL: https://jlcpcb.com/partdetail/C251826; ComponentLink3Description: LCSC Part URL; ComponentLink3URL: https://lcsc.com/product-detail/Inductors-SMD_EMTEK-EMTEK-HSC0805-33NJ-T_C251826.html
footprint IND-0805 (0805 (2012M) Inductor)
pins: 1, 2

## HSC0805-39NJ-T
designator L?  Inductance: 39nH
Inductor, 39nH, ±5%, 290mΩ, 500mA, SMD 0805; Manufacturer: EMTEK; Manufacturer Part Number: HSC0805-39NJ-T; Self-Resonant Frequency: 2GHz; Q Factor: 60@500MHz; Package Size: 0805; JLCPCB Basic Part: No; JLCPCB Part Number: C251827; Supplier 1: LCSC; Category: Inductors; Supplier Part Number 1: C251827; Tolerance: ±5%; Rated Current: 500mA; DC Resistance: 290mΩ; RoHS: Yes; ComponentLink1Description: Datasheet; ComponentLink1URL: https://wmsc.lcsc.com/wmsc/upload/file/pdf/v2/lcsc/2304140030_EMTEK-HSC0805-39NJ-T_C251827.pdf; ComponentLink2Description: JLCPCB Part URL; ComponentLink2URL: https://jlcpcb.com/partdetail/C251827; ComponentLink3Description: LCSC Part URL; ComponentLink3URL: https://lcsc.com/product-detail/Inductors-SMD_EMTEK-EMTEK-HSC0805-39NJ-T_C251827.html
footprint IND-0805 (0805 (2012M) Inductor)
pins: 1, 2

## HSC0805-43NJ-T
designator L?  Inductance: 43nH
Inductor, 43nH, ±5%, 340mΩ, 500mA, SMD 0805; Manufacturer: EMTEK; Manufacturer Part Number: HSC0805-43NJ-T; Self-Resonant Frequency: 1.65GHz; Q Factor: 60@500MHz; Package Size: 0805; JLCPCB Basic Part: No; JLCPCB Part Number: C251828; Supplier 1: LCSC; Category: Inductors; Supplier Part Number 1: C251828; Tolerance: ±5%; Rated Current: 500mA; DC Resistance: 340mΩ; RoHS: Yes; ComponentLink1Description: Datasheet; ComponentLink1URL: https://wmsc.lcsc.com/wmsc/upload/file/pdf/v2/lcsc/2304140030_EMTEK-HSC0805-43NJ-T_C251828.pdf; ComponentLink2Description: JLCPCB Part URL; ComponentLink2URL: https://jlcpcb.com/partdetail/C251828; ComponentLink3Description: LCSC Part URL; ComponentLink3URL: https://lcsc.com/product-detail/Inductors-SMD_EMTEK-EMTEK-HSC0805-43NJ-T_C251828.html
footprint IND-0805 (0805 (2012M) Inductor)
pins: 1, 2

## HSC0805-68NJ-T
designator L?  Inductance: 68nH
Inductor, 68nH, ±5%, 380mΩ, 500mA, SMD 0805; Manufacturer: EMTEK; Manufacturer Part Number: HSC0805-68NJ-T; Self-Resonant Frequency: 1.45GHz; Q Factor: 60@500MHz; Package Size: 0805; JLCPCB Basic Part: No; JLCPCB Part Number: C251830; Supplier 1: LCSC; Category: Inductors; Supplier Part Number 1: C251830; Tolerance: ±5%; Rated Current: 500mA; DC Resistance: 380mΩ; RoHS: Yes; ComponentLink1Description: Datasheet; ComponentLink1URL: https://wmsc.lcsc.com/wmsc/upload/file/pdf/v2/lcsc/2304140030_EMTEK-HSC0805-68NJ-T_C251830.pdf; ComponentLink2Description: JLCPCB Part URL; ComponentLink2URL: https://jlcpcb.com/partdetail/C251830; ComponentLink3Description: LCSC Part URL; ComponentLink3URL: https://lcsc.com/product-detail/Inductors-SMD_EMTEK-EMTEK-HSC0805-68NJ-T_C251830.html
footprint IND-0805 (0805 (2012M) Inductor)
pins: 1, 2

## HSC0805-75NJ-T
designator L?  Inductance: 75nH
Inductor, 75nH, ±5%, 400mΩ, 400mA, SMD 0805; Manufacturer: EMTEK; Manufacturer Part Number: HSC0805-75NJ-T; Self-Resonant Frequency: 1.4GHz; Q Factor: 60@500MHz; Package Size: 0805; JLCPCB Basic Part: No; JLCPCB Part Number: C251863; Supplier 1: LCSC; Category: Inductors; Supplier Part Number 1: C251863; Tolerance: ±5%; Rated Current: 400mA; DC Resistance: 400mΩ; RoHS: Yes; ComponentLink1Description: Datasheet; ComponentLink1URL: https://wmsc.lcsc.com/wmsc/upload/file/pdf/v2/lcsc/2304140030_EMTEK-HSC0805-75NJ-T_C251863.pdf; ComponentLink2Description: JLCPCB Part URL; ComponentLink2URL: https://jlcpcb.com/partdetail/C251863; ComponentLink3Description: LCSC Part URL; ComponentLink3URL: https://lcsc.com/product-detail/Inductors-SMD_EMTEK-EMTEK-HSC0805-75NJ-T_C251863.html
footprint IND-0805 (0805 (2012M) Inductor)
pins: 1, 2

## HSC0805-R10J-T
designator L?  Inductance: 100nH
Inductor, 100nH, ±5%, 460mΩ, 400mA, SMD 0805; Manufacturer: EMTEK; Manufacturer Part Number: HSC0805-R10J-T; Self-Resonant Frequency: 1.2GHz; Q Factor: 65@500MHz; Package Size: 0805; JLCPCB Basic Part: No; JLCPCB Part Number: C251832; Supplier 1: LCSC; Category: Inductors; Supplier Part Number 1: C251832; Tolerance: ±5%; Rated Current: 400mA; DC Resistance: 460mΩ; RoHS: Yes; ComponentLink1Description: Datasheet; ComponentLink1URL: https://wmsc.lcsc.com/wmsc/upload/file/pdf/v2/lcsc/2304140030_EMTEK-HSC0805-R10J-T_C251832.pdf; ComponentLink2Description: JLCPCB Part URL; ComponentLink2URL: https://jlcpcb.com/partdetail/C251832; ComponentLink3Description: LCSC Part URL; ComponentLink3URL: https://lcsc.com/product-detail/Inductors-SMD_EMTEK-EMTEK-HSC0805-R10J-T_C251832.html
footprint IND-0805 (0805 (2012M) Inductor)
pins: 1, 2

## HSC0805-R15J-T
designator L?  Inductance: 150nH
Inductor, 150nH, ±5%, 560mΩ, 400mA, SMD 0805; Manufacturer: EMTEK; Manufacturer Part Number: HSC0805-R15J-T; Self-Resonant Frequency: 920MHz; Q Factor: 50@250MHz; Package Size: 0805; JLCPCB Basic Part: No; JLCPCB Part Number: C251834; Supplier 1: LCSC; Category: Inductors; Supplier Part Number 1: C251834; Tolerance: ±5%; Rated Current: 400mA; DC Resistance: 560mΩ; RoHS: Yes; ComponentLink1Description: Datasheet; ComponentLink1URL: https://wmsc.lcsc.com/wmsc/upload/file/pdf/v2/lcsc/2304140030_EMTEK-HSC0805-R15J-T_C251834.pdf; ComponentLink2Description: JLCPCB Part URL; ComponentLink2URL: https://jlcpcb.com/partdetail/C251834; ComponentLink3Description: LCSC Part URL; ComponentLink3URL: https://lcsc.com/product-detail/Inductors-SMD_EMTEK-EMTEK-HSC0805-R15J-T_C251834.html
footprint IND-0805 (0805 (2012M) Inductor)
pins: 1, 2